# Altium integrated library WCAP-ATG5_rev15a.intlib: 201 symbols (part 2 of 3) (continued)
## WCAP-ATG5 10x12.5x5x0.6 860020775015
designator C?, comment 100 μF
WCAP-ATG5 Aluminum Electrolytic Capacitors , 100 μF; + / - 20%; 63 V , 10 x 12,5; Manufacturer: Wurth Elektronik; partNo: 860020775015; E-mail: libraries@we-online.com; Characteristics: Aluminum Electrolytic Capacitor; Recommended soldering: Wave; Operating temperature:–40 °C to +105 °C for UR < 400 V; –25 °C to +105 °C for UR ≥ 400 V; General purpose product series with max. temperature of +105 °C; Load life: 2000 h @ +105 °C; ComponentLink1Description: Manufacturer; ComponentLink1URL: http://www.we-online.com; ComponentLink2Description: Datasheet; ComponentLink2URL: http://katalog.we-online.de/pbs/datasheet/860020775015.pdf; Created by: Karrer Zheng; Created Date: 6/8/2015; Capacitance: 100 μF; Application: Medium and high voltage type range from 160V-450V used as primary side input filter in power supply; Low voltage type used as energy storage or low frequency filtering in circuit, applied to general switching power supply, AC-DC converter, adapter, charger, TV, VCR, DC motor circuit filter, digital audio, digital cameras, digital video cameras, satellite receiver etc.
footprint WCAP-ATG5 10x12.5x5x0.6
pins: 1, 2

## WCAP-ATG5 10x16x5x0.6 860020775016
designator C?, comment 120 μF
WCAP-ATG5 Aluminum Electrolytic Capacitors , 120 μF; + / - 20%; 63 V , 10 x 16; Manufacturer: Wurth Elektronik; partNo: 860020775016; E-mail: libraries@we-online.com; Characteristics: Aluminum Electrolytic Capacitor; Recommended soldering: Wave; Operating temperature:–40 °C to +105 °C for UR < 400 V; –25 °C to +105 °C for UR ≥ 400 V; General purpose product series with max. temperature of +105 °C; Load life: 2000 h @ +105 °C; ComponentLink1Description: Manufacturer; ComponentLink1URL: http://www.we-online.com; ComponentLink2Description: Datasheet; ComponentLink2URL: http://katalog.we-online.de/pbs/datasheet/860020775016.pdf; Created by: Karrer Zheng; Created Date: 6/8/2015; Capacitance: 120 μF; Application: Medium and high voltage type range from 160V-450V used as primary side input filter in power supply; Low voltage type used as energy storage or low frequency filtering in circuit, applied to general switching power supply, AC-DC converter, adapter, charger, TV, VCR, DC motor circuit filter, digital audio, digital cameras, digital video cameras, satellite receiver etc.
footprint WCAP-ATG5 10x16x5x0.6
pins: 1, 2

## WCAP-ATG5 10x16x5x0.6 860020775017
designator C?, comment 150 μF
WCAP-ATG5 Aluminum Electrolytic Capacitors , 150 μF; + / - 20%; 63 V , 10 x 16; Manufacturer: Wurth Elektronik; partNo: 860020775017; E-mail: libraries@we-online.com; Characteristics: Aluminum Electrolytic Capacitor; Recommended soldering: Wave; Operating temperature:–40 °C to +105 °C for UR < 400 V; –25 °C to +105 °C for UR ≥ 400 V; General purpose product series with max. temperature of +105 °C; Load life: 2000 h @ +105 °C; ComponentLink1Description: Manufacturer; ComponentLink1URL: http://www.we-online.com; ComponentLink2Description: Datasheet; ComponentLink2URL: http://katalog.we-online.de/pbs/datasheet/860020775017.pdf; Created by: Karrer Zheng; Created Date: 6/8/2015; Capacitance: 150 μF; Application: Medium and high voltage type range from 160V-450V used as primary side input filter in power supply; Low voltage type used as energy storage or low frequency filtering in circuit, applied to general switching power supply, AC-DC converter, adapter, charger, TV, VCR, DC motor circuit filter, digital audio, digital cameras, digital video cameras, satellite receiver etc.
footprint WCAP-ATG5 10x16x5x0.6
pins: 1, 2

## WCAP-ATG5 10x16x5x0.6 860020775018
designator C?, comment 180 μF
WCAP-ATG5 Aluminum Electrolytic Capacitors , 180 μF; + / - 20%; 63 V , 10 x 16; Manufacturer: Wurth Elektronik; partNo: 860020775018; E-mail: libraries@we-online.com; Characteristics: Aluminum Electrolytic Capacitor; Recommended soldering: Wave; Operating temperature:–40 °C to +105 °C for UR < 400 V; –25 °C to +105 °C for UR ≥ 400 V; General purpose product series with max. temperature of +105 °C; Load life: 2000 h @ +105 °C; ComponentLink1Description: Manufacturer; ComponentLink1URL: http://www.we-online.com; ComponentLink2Description: Datasheet; ComponentLink2URL: http://katalog.we-online.de/pbs/datasheet/860020775018.pdf; Created by: Karrer Zheng; Created Date: 6/8/2015; Capacitance: 180 μF; Application: Medium and high voltage type range from 160V-450V used as primary side input filter in power supply; Low voltage type used as energy storage or low frequency filtering in circuit, applied to general switching power supply, AC-DC converter, adapter, charger, TV, VCR, DC motor circuit filter, digital audio, digital cameras, digital video cameras, satellite receiver etc.
footprint WCAP-ATG5 10x16x5x0.6
pins: 1, 2

## WCAP-ATG5 10x16x5x0.6 860020775019
designator C?, comment 220 μF
WCAP-ATG5 Aluminum Electrolytic Capacitors , 220 μF; + / - 20%; 63 V , 10 x 16; Manufacturer: Wurth Elektronik; partNo: 860020775019; E-mail: libraries@we-online.com; Characteristics: Aluminum Electrolytic Capacitor; Recommended soldering: Wave; Operating temperature:–40 °C to +105 °C for UR < 400 V; –25 °C to +105 °C for UR ≥ 400 V; General purpose product series with max. temperature of +105 °C; Load life: 2000 h @ +105 °C; ComponentLink1Description: Manufacturer; ComponentLink1URL: http://www.we-online.com; ComponentLink2Description: Datasheet; ComponentLink2URL: http://katalog.we-online.de/pbs/datasheet/860020775019.pdf; Created by: Karrer Zheng; Created Date: 6/8/2015; Capacitance: 220 μF; Application: Medium and high voltage type range from 160V-450V used as primary side input filter in power supply; Low voltage type used as energy storage or low frequency filtering in circuit, applied to general switching power supply, AC-DC converter, adapter, charger, TV, VCR, DC motor circuit filter, digital audio, digital cameras, digital video cameras, satellite receiver etc.
footprint WCAP-ATG5 10x16x5x0.6
pins: 1, 2

## WCAP-ATG5 13x20x5x0.6 860020778020
designator C?, comment 330 μF
WCAP-ATG5 Aluminum Electrolytic Capacitors , 330 μF; + / - 20%; 63 V , 13 x 20; Manufacturer: Wurth Elektronik; partNo: 860020778020; E-mail: libraries@we-online.com; Characteristics: Aluminum Electrolytic Capacitor; Recommended soldering: Wave; Operating temperature:–40 °C to +105 °C for UR < 400 V; –25 °C to +105 °C for UR ≥ 400 V; General purpose product series with max. temperature of +105 °C; Load life: 2000 h @ +105 °C; ComponentLink1Description: Manufacturer; ComponentLink1URL: http://www.we-online.com; ComponentLink2Description: Datasheet; ComponentLink2URL: http://katalog.we-online.de/pbs/datasheet/860020778020.pdf; Created by: Karrer Zheng; Created Date: 6/8/2015; Capacitance: 330 μF; Application: Medium and high voltage type range from 160V-450V used as primary side input filter in power supply; Low voltage type used as energy storage or low frequency filtering in circuit, applied to general switching power supply, AC-DC converter, adapter, charger, TV, VCR, DC motor circuit filter, digital audio, digital cameras, digital video cameras, satellite receiver etc.
footprint WCAP-ATG5 13x20x5x0.6
pins: 1, 2

## WCAP-ATG5 13x20x5x0.6 860020778021
designator C?, comment 470 μF
WCAP-ATG5 Aluminum Electrolytic Capacitors , 470 μF; + / - 20%; 63 V , 13 x 20; Manufacturer: Wurth Elektronik; partNo: 860020778021; E-mail: libraries@we-online.com; Characteristics: Aluminum Electrolytic Capacitor; Recommended soldering: Wave; Operating temperature:–40 °C to +105 °C for UR < 400 V; –25 °C to +105 °C for UR ≥ 400 V; General purpose product series with max. temperature of +105 °C; Load life: 2000 h @ +105 °C; ComponentLink1Description: Manufacturer; ComponentLink1URL: http://www.we-online.com; ComponentLink2Description: Datasheet; ComponentLink2URL: http://katalog.we-online.de/pbs/datasheet/860020778021.pdf; Created by: Karrer Zheng; Created Date: 6/8/2015; Capacitance: 470 μF; Application: Medium and high voltage type range from 160V-450V used as primary side input filter in power supply; Low voltage type used as energy storage or low frequency filtering in circuit, applied to general switching power supply, AC-DC converter, adapter, charger, TV, VCR, DC motor circuit filter, digital audio, digital cameras, digital video cameras, satellite receiver etc.
footprint WCAP-ATG5 13x20x5x0.6
pins: 1, 2

## WCAP-ATG5 13x25x5x0.6 860020778022
designator C?, comment 560 μF
WCAP-ATG5 Aluminum Electrolytic Capacitors , 560 μF; + / - 20%; 63 V , 13 x 25; Manufacturer: Wurth Elektronik; partNo: 860020778022; E-mail: libraries@we-online.com; Characteristics: Aluminum Electrolytic Capacitor; Recommended soldering: Wave; Operating temperature:–40 °C to +105 °C for UR < 400 V; –25 °C to +105 °C for UR ≥ 400 V; General purpose product series with max. temperature of +105 °C; Load life: 2000 h @ +105 °C; ComponentLink1Description: Manufacturer; ComponentLink1URL: http://www.we-online.com; ComponentLink2Description: Datasheet; ComponentLink2URL: http://katalog.we-online.de/pbs/datasheet/860020778022.pdf; Created by: Karrer Zheng; Created Date: 6/8/2015; Capacitance: 560 μF; Application: Medium and high voltage type range from 160V-450V used as primary side input filter in power supply; Low voltage type used as energy storage or low frequency filtering in circuit, applied to general switching power supply, AC-DC converter, adapter, charger, TV, VCR, DC motor circuit filter, digital audio, digital cameras, digital video cameras, satellite receiver etc.
footprint WCAP-ATG5 13x25x5x0.6
pins: 1, 2

## WCAP-ATG5 16x25x7.5x0.8 860020780023
designator C?, comment 680 μF
WCAP-ATG5 Aluminum Electrolytic Capacitors , 680 μF; + / - 20%; 63 V , 16 x 25; Manufacturer: Wurth Elektronik; partNo: 860020780023; E-mail: libraries@we-online.com; Characteristics: Aluminum Electrolytic Capacitor; Recommended soldering: Wave; Operating temperature:–40 °C to +105 °C for UR < 400 V; –25 °C to +105 °C for UR ≥ 400 V; General purpose product series with max. temperature of +105 °C; Load life: 2000 h @ +105 °C; ComponentLink1Description: Manufacturer; ComponentLink1URL: http://www.we-online.com; ComponentLink2Description: Datasheet; ComponentLink2URL: http://katalog.we-online.de/pbs/datasheet/860020780023.pdf; Created by: Karrer Zheng; Created Date: 6/8/2015; Capacitance: 680 μF; Application: Medium and high voltage type range from 160V-450V used as primary side input filter in power supply; Low voltage type used as energy storage or low frequency filtering in circuit, applied to general switching power supply, AC-DC converter, adapter, charger, TV, VCR, DC motor circuit filter, digital audio, digital cameras, digital video cameras, satellite receiver etc.
footprint WCAP-ATG5 16x25x7.5x0.8
pins: 1, 2

## WCAP-ATG5 16x25x7.5x0.8 860020780024
designator C?, comment 820 μF
WCAP-ATG5 Aluminum Electrolytic Capacitors , 820 μF; + / - 20%; 63 V , 16 x 25; Manufacturer: Wurth Elektronik; partNo: 860020780024; E-mail: libraries@we-online.com; Characteristics: Aluminum Electrolytic Capacitor; Recommended soldering: Wave; Operating temperature:–40 °C to +105 °C for UR < 400 V; –25 °C to +105 °C for UR ≥ 400 V; General purpose product series with max. temperature of +105 °C; Load life: 2000 h @ +105 °C; ComponentLink1Description: Manufacturer; ComponentLink1URL: http://www.we-online.com; ComponentLink2Description: Datasheet; ComponentLink2URL: http://katalog.we-online.de/pbs/datasheet/860020780024.pdf; Created by: Karrer Zheng; Created Date: 6/8/2015; Capacitance: 820 μF; Application: Medium and high voltage type range from 160V-450V used as primary side input filter in power supply; Low voltage type used as energy storage or low frequency filtering in circuit, applied to general switching power supply, AC-DC converter, adapter, charger, TV, VCR, DC motor circuit filter, digital audio, digital cameras, digital video cameras, satellite receiver etc.
footprint WCAP-ATG5 16x25x7.5x0.8
pins: 1, 2

## WCAP-ATG5 16x31.5x7.5x0.8 860020780025
designator C?, comment 1000 μF
WCAP-ATG5 Aluminum Electrolytic Capacitors , 1000 μF; + / - 20%; 63 V , 16 x 31,5; Manufacturer: Wurth Elektronik; partNo: 860020780025; E-mail: libraries@we-online.com; Characteristics: Aluminum Electrolytic Capacitor; Recommended soldering: Wave; Operating temperature:–40 °C to +105 °C for UR < 400 V; –25 °C to +105 °C for UR ≥ 400 V; General purpose product series with max. temperature of +105 °C; Load life: 2000 h @ +105 °C; ComponentLink1Description: Manufacturer; ComponentLink1URL: http://www.we-online.com; ComponentLink2Description: Datasheet; ComponentLink2URL: http://katalog.we-online.de/pbs/datasheet/860020780025.pdf; Created by: Karrer Zheng; Created Date: 6/8/2015; Capacitance: 1000 μF; Application: Medium and high voltage type range from 160V-450V used as primary side input filter in power supply; Low voltage type used as energy storage or low frequency filtering in circuit, applied to general switching power supply, AC-DC converter, adapter, charger, TV, VCR, DC motor circuit filter, digital audio, digital cameras, digital video cameras, satellite receiver etc.
footprint WCAP-ATG5 16x31.5x7.5x0.8
pins: 1, 2

## WCAP-ATG5 16x35.5x7.5x0.8 860020780026
designator C?, comment 1200 μF
WCAP-ATG5 Aluminum Electrolytic Capacitors , 1200 μF; + / - 20%; 63 V , 16 x 35,5; Manufacturer: Wurth Elektronik; partNo: 860020780026; E-mail: libraries@we-online.com; Characteristics: Aluminum Electrolytic Capacitor; Recommended soldering: Wave; Operating temperature:–40 °C to +105 °C for UR < 400 V; –25 °C to +105 °C for UR ≥ 400 V; General purpose product series with max. temperature of +105 °C; Load life: 2000 h @ +105 °C; ComponentLink1Description: Manufacturer; ComponentLink1URL: http://www.we-online.com; ComponentLink2Description: Datasheet; ComponentLink2URL: http://katalog.we-online.de/pbs/datasheet/860020780026.pdf; Created by: Karrer Zheng; Created Date: 6/8/2015; Capacitance: 1200 μF; Application: Medium and high voltage type range from 160V-450V used as primary side input filter in power supply; Low voltage type used as energy storage or low frequency filtering in circuit, applied to general switching power supply, AC-DC converter, adapter, charger, TV, VCR, DC motor circuit filter, digital audio, digital cameras, digital video cameras, satellite receiver etc.
footprint WCAP-ATG5 16x35.5x7.5x0.8
pins: 1, 2

## WCAP-ATG5 18x31.5x7.5x0.8 860020781027
designator C?, comment 1500 μF
WCAP-ATG5 Aluminum Electrolytic Capacitors , 1500 μF; + / - 20%; 63 V , 18 x 31,5; Manufacturer: Wurth Elektronik; partNo: 860020781027; E-mail: libraries@we-online.com; Characteristics: Aluminum Electrolytic Capacitor; Recommended soldering: Wave; Operating temperature:–40 °C to +105 °C for UR < 400 V; –25 °C to +105 °C for UR ≥ 400 V; General purpose product series with max. temperature of +105 °C; Load life: 2000 h @ +105 °C; ComponentLink1Description: Manufacturer; ComponentLink1URL: http://www.we-online.com; ComponentLink2Description: Datasheet; ComponentLink2URL: http://katalog.we-online.de/pbs/datasheet/860020781027.pdf; Created by: Karrer Zheng; Created Date: 6/8/2015; Capacitance: 1500 μF; Application: Medium and high voltage type range from 160V-450V used as primary side input filter in power supply; Low voltage type used as energy storage or low frequency filtering in circuit, applied to general switching power supply, AC-DC converter, adapter, charger, TV, VCR, DC motor circuit filter, digital audio, digital cameras, digital video cameras, satellite receiver etc.
footprint WCAP-ATG5 18x31.5x7.5x0.8
pins: 1, 2


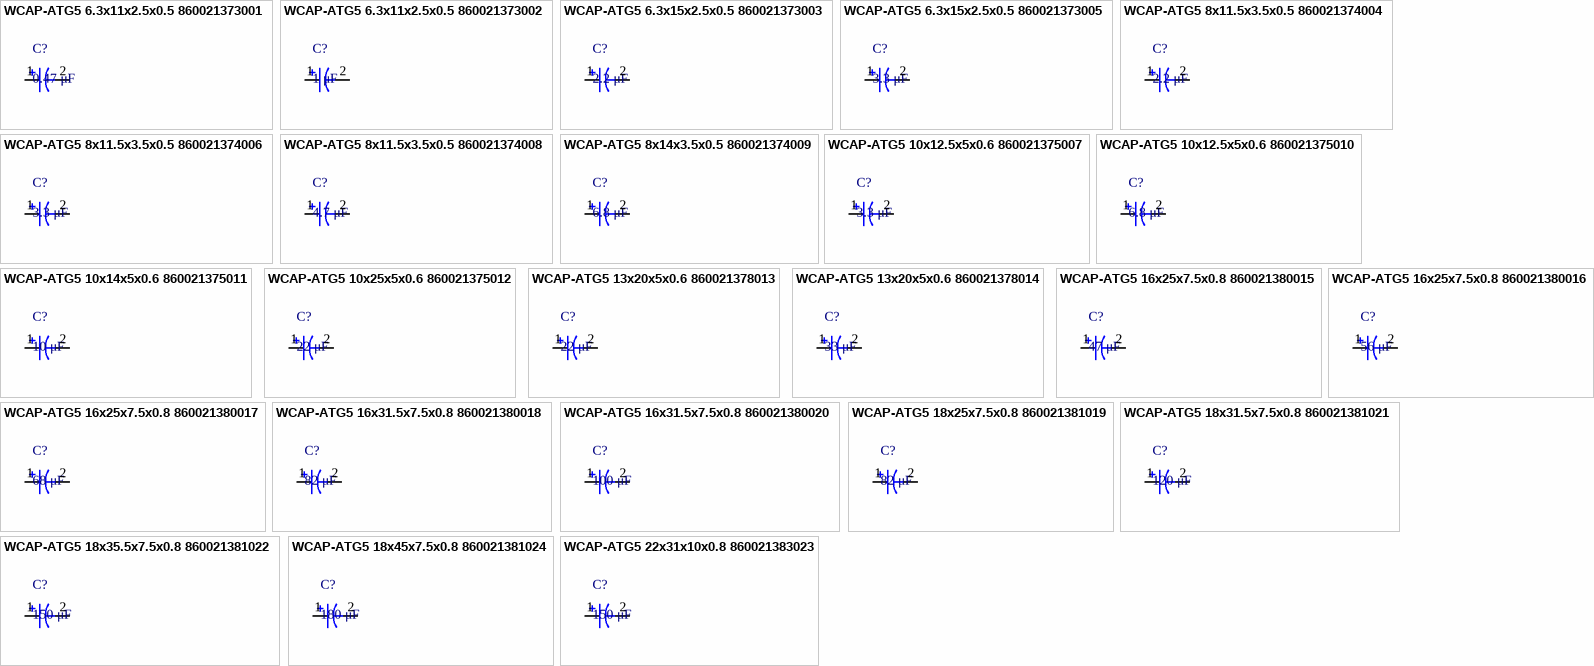
[diagram p5: symbols WCAP-ATG5 6.3x11x2.5x0.5 860021373001 to WCAP-ATG5 22x31x10x0.8 860021383023]

## WCAP-ATG5 6.3x11x2.5x0.5 860021373001
designator C?, comment 0.47 μF
WCAP-ATG5 Aluminum Electrolytic Capacitors , 0,47 μF; + / - 20%; 400 V , 6,3 x 11; Manufacturer: Wurth Elektronik; partNo: 860021373001; E-mail: libraries@we-online.com; Characteristics: Aluminum Electrolytic Capacitor; Recommended soldering: Wave; Operating temperature:–40 °C to +105 °C for UR < 400 V; –25 °C to +105 °C for UR ≥ 400 V; General purpose product series with max. temperature of +105 °C; Load life: 2000 h @ +105 °C; ComponentLink1Description: Manufacturer; ComponentLink1URL: http://www.we-online.com; ComponentLink2Description: Datasheet; ComponentLink2URL: http://katalog.we-online.de/pbs/datasheet/860021373001.pdf; Created by: Karrer Zheng; Created Date: 6/8/2015; Capacitance: 0.47 μF; Application: Medium and high voltage type range from 160V-450V used as primary side input filter in power supply; Low voltage type used as energy storage or low frequency filtering in circuit, applied to general switching power supply, AC-DC converter, adapter, charger, TV, VCR, DC motor circuit filter, digital audio, digital cameras, digital video cameras, satellite receiver etc.
footprint WCAP-ATG5 6.3x11x2.5x0.5
pins: 1, 2

## WCAP-ATG5 6.3x11x2.5x0.5 860021373002
designator C?, comment 1 μF
WCAP-ATG5 Aluminum Electrolytic Capacitors , 1 μF; + / - 20%; 400 V , 6,3 x 11; Manufacturer: Wurth Elektronik; partNo: 860021373002; E-mail: libraries@we-online.com; Characteristics: Aluminum Electrolytic Capacitor; Recommended soldering: Wave; Operating temperature:–40 °C to +105 °C for UR < 400 V; –25 °C to +105 °C for UR ≥ 400 V; General purpose product series with max. temperature of +105 °C; Load life: 2000 h @ +105 °C; ComponentLink1Description: Manufacturer; ComponentLink1URL: http://www.we-online.com; ComponentLink2Description: Datasheet; ComponentLink2URL: http://katalog.we-online.de/pbs/datasheet/860021373002.pdf; Created by: Karrer Zheng; Created Date: 6/8/2015; Capacitance: 1 μF; Application: Medium and high voltage type range from 160V-450V used as primary side input filter in power supply; Low voltage type used as energy storage or low frequency filtering in circuit, applied to general switching power supply, AC-DC converter, adapter, charger, TV, VCR, DC motor circuit filter, digital audio, digital cameras, digital video cameras, satellite receiver etc.
footprint WCAP-ATG5 6.3x11x2.5x0.5
pins: 1, 2

## WCAP-ATG5 6.3x15x2.5x0.5 860021373003
designator C?, comment 2.2 μF
WCAP-ATG5 Aluminum Electrolytic Capacitors , 2,2 μF; + / - 20%; 400 V , 6,3 x 15; Manufacturer: Wurth Elektronik; partNo: 860021373003; E-mail: libraries@we-online.com; Characteristics: Aluminum Electrolytic Capacitor; Recommended soldering: Wave; Operating temperature:–40 °C to +105 °C for UR < 400 V; –25 °C to +105 °C for UR ≥ 400 V; General purpose product series with max. temperature of +105 °C; Load life: 2000 h @ +105 °C; ComponentLink1Description: Manufacturer; ComponentLink1URL: http://www.we-online.com; ComponentLink2Description: Datasheet; ComponentLink2URL: http://katalog.we-online.de/pbs/datasheet/860021373003.pdf; Created by: Karrer Zheng; Created Date: 6/8/2015; Capacitance: 2.2 μF; Application: Medium and high voltage type range from 160V-450V used as primary side input filter in power supply; Low voltage type used as energy storage or low frequency filtering in circuit, applied to general switching power supply, AC-DC converter, adapter, charger, TV, VCR, DC motor circuit filter, digital audio, digital cameras, digital video cameras, satellite receiver etc.
footprint WCAP-ATG5 6.3x15x2.5x0.5
pins: 1, 2

## WCAP-ATG5 6.3x15x2.5x0.5 860021373005
designator C?, comment 3.3 μF
WCAP-ATG5 Aluminum Electrolytic Capacitors , 3,3 μF; + / - 20%; 400 V , 6,3 x 15; Manufacturer: Wurth Elektronik; partNo: 860021373005; E-mail: libraries@we-online.com; Characteristics: Aluminum Electrolytic Capacitor; Recommended soldering: Wave; Operating temperature:–40 °C to +105 °C for UR < 400 V; –25 °C to +105 °C for UR ≥ 400 V; General purpose product series with max. temperature of +105 °C; Load life: 2000 h @ +105 °C; ComponentLink1Description: Manufacturer; ComponentLink1URL: http://www.we-online.com; ComponentLink2Description: Datasheet; ComponentLink2URL: http://katalog.we-online.de/pbs/datasheet/860021373005.pdf; Created by: Karrer Zheng; Created Date: 6/8/2015; Capacitance: 3.3 μF; Application: Medium and high voltage type range from 160V-450V used as primary side input filter in power supply; Low voltage type used as energy storage or low frequency filtering in circuit, applied to general switching power supply, AC-DC converter, adapter, charger, TV, VCR, DC motor circuit filter, digital audio, digital cameras, digital video cameras, satellite receiver etc.
footprint WCAP-ATG5 6.3x15x2.5x0.5
pins: 1, 2

## WCAP-ATG5 8x11.5x3.5x0.5 860021374004
designator C?, comment 2.2 μF
WCAP-ATG5 Aluminum Electrolytic Capacitors , 2,2 μF; + / - 20%; 400 V , 8 x 11,5; Manufacturer: Wurth Elektronik; partNo: 860021374004; E-mail: libraries@we-online.com; Characteristics: Aluminum Electrolytic Capacitor; Recommended soldering: Wave; Operating temperature:–40 °C to +105 °C for UR < 400 V; –25 °C to +105 °C for UR ≥ 400 V; General purpose product series with max. temperature of +105 °C; Load life: 2000 h @ +105 °C; ComponentLink1Description: Manufacturer; ComponentLink1URL: http://www.we-online.com; ComponentLink2Description: Datasheet; ComponentLink2URL: http://katalog.we-online.de/pbs/datasheet/860021374004.pdf; Created by: Karrer Zheng; Created Date: 6/8/2015; Capacitance: 2.2 μF; Application: Medium and high voltage type range from 160V-450V used as primary side input filter in power supply; Low voltage type used as energy storage or low frequency filtering in circuit, applied to general switching power supply, AC-DC converter, adapter, charger, TV, VCR, DC motor circuit filter, digital audio, digital cameras, digital video cameras, satellite receiver etc.
footprint WCAP-ATG5 8x11.5x3.5x0.5
pins: 1, 2

## WCAP-ATG5 8x11.5x3.5x0.5 860021374006
designator C?, comment 3.3 μF
WCAP-ATG5 Aluminum Electrolytic Capacitors , 3,3 μF; + / - 20%; 400 V , 8 x 11,5; Manufacturer: Wurth Elektronik; partNo: 860021374006; E-mail: libraries@we-online.com; Characteristics: Aluminum Electrolytic Capacitor; Recommended soldering: Wave; Operating temperature:–40 °C to +105 °C for UR < 400 V; –25 °C to +105 °C for UR ≥ 400 V; General purpose product series with max. temperature of +105 °C; Load life: 2000 h @ +105 °C; ComponentLink1Description: Manufacturer; ComponentLink1URL: http://www.we-online.com; ComponentLink2Description: Datasheet; ComponentLink2URL: http://katalog.we-online.de/pbs/datasheet/860021374006.pdf; Created by: Karrer Zheng; Created Date: 6/8/2015; Capacitance: 3.3 μF; Application: Medium and high voltage type range from 160V-450V used as primary side input filter in power supply; Low voltage type used as energy storage or low frequency filtering in circuit, applied to general switching power supply, AC-DC converter, adapter, charger, TV, VCR, DC motor circuit filter, digital audio, digital cameras, digital video cameras, satellite receiver etc.
footprint WCAP-ATG5 8x11.5x3.5x0.5
pins: 1, 2

## WCAP-ATG5 8x11.5x3.5x0.5 860021374008
designator C?, comment 4.7 μF
WCAP-ATG5 Aluminum Electrolytic Capacitors , 4,7 μF; + / - 20%; 400 V , 8 x 11,5; Manufacturer: Wurth Elektronik; partNo: 860021374008; E-mail: libraries@we-online.com; Characteristics: Aluminum Electrolytic Capacitor; Recommended soldering: Wave; Operating temperature:–40 °C to +105 °C for UR < 400 V; –25 °C to +105 °C for UR ≥ 400 V; General purpose product series with max. temperature of +105 °C; Load life: 2000 h @ +105 °C; ComponentLink1Description: Manufacturer; ComponentLink1URL: http://www.we-online.com; ComponentLink2Description: Datasheet; ComponentLink2URL: http://katalog.we-online.de/pbs/datasheet/860021374008.pdf; Created by: Karrer Zheng; Created Date: 6/8/2015; Capacitance: 4.7 μF; Application: Medium and high voltage type range from 160V-450V used as primary side input filter in power supply; Low voltage type used as energy storage or low frequency filtering in circuit, applied to general switching power supply, AC-DC converter, adapter, charger, TV, VCR, DC motor circuit filter, digital audio, digital cameras, digital video cameras, satellite receiver etc.
footprint WCAP-ATG5 8x11.5x3.5x0.5
pins: 1, 2

## WCAP-ATG5 8x14x3.5x0.5 860021374009
designator C?, comment 6.8 μF
WCAP-ATG5 Aluminum Electrolytic Capacitors , 6,8 μF; + / - 20%; 400 V , 8 x 14; Manufacturer: Wurth Elektronik; partNo: 860021374009; E-mail: libraries@we-online.com; Characteristics: Aluminum Electrolytic Capacitor; Recommended soldering: Wave; Operating temperature:–40 °C to +105 °C for UR < 400 V; –25 °C to +105 °C for UR ≥ 400 V; General purpose product series with max. temperature of +105 °C; Load life: 2000 h @ +105 °C; ComponentLink1Description: Manufacturer; ComponentLink1URL: http://www.we-online.com; ComponentLink2Description: Datasheet; ComponentLink2URL: http://katalog.we-online.de/pbs/datasheet/860021374009.pdf; Created by: Karrer Zheng; Created Date: 6/8/2015; Capacitance: 6.8 μF; Application: Medium and high voltage type range from 160V-450V used as primary side input filter in power supply; Low voltage type used as energy storage or low frequency filtering in circuit, applied to general switching power supply, AC-DC converter, adapter, charger, TV, VCR, DC motor circuit filter, digital audio, digital cameras, digital video cameras, satellite receiver etc.
footprint WCAP-ATG5 8x14x3.5x0.5
pins: 1, 2

## WCAP-ATG5 10x12.5x5x0.6 860021375007
designator C?, comment 3.3 μF
WCAP-ATG5 Aluminum Electrolytic Capacitors , 3,3 μF; + / - 20%; 400 V , 10 x 12,5; Manufacturer: Wurth Elektronik; partNo: 860021375007; E-mail: libraries@we-online.com; Characteristics: Aluminum Electrolytic Capacitor; Recommended soldering: Wave; Operating temperature:–40 °C to +105 °C for UR < 400 V; –25 °C to +105 °C for UR ≥ 400 V; General purpose product series with max. temperature of +105 °C; Load life: 2000 h @ +105 °C; ComponentLink1Description: Manufacturer; ComponentLink1URL: http://www.we-online.com; ComponentLink2Description: Datasheet; ComponentLink2URL: http://katalog.we-online.de/pbs/datasheet/860021375007.pdf; Created by: Karrer Zheng; Created Date: 6/8/2015; Capacitance: 3.3 μF; Application: Medium and high voltage type range from 160V-450V used as primary side input filter in power supply; Low voltage type used as energy storage or low frequency filtering in circuit, applied to general switching power supply, AC-DC converter, adapter, charger, TV, VCR, DC motor circuit filter, digital audio, digital cameras, digital video cameras, satellite receiver etc.
footprint WCAP-ATG5 10x12.5x5x0.6
pins: 1, 2

## WCAP-ATG5 10x12.5x5x0.6 860021375010
designator C?, comment 6.8 μF
WCAP-ATG5 Aluminum Electrolytic Capacitors , 6,8 μF; + / - 20%; 400 V , 10 x 12,5; Manufacturer: Wurth Elektronik; partNo: 860021375010; E-mail: libraries@we-online.com; Characteristics: Aluminum Electrolytic Capacitor; Recommended soldering: Wave; Operating temperature:–40 °C to +105 °C for UR < 400 V; –25 °C to +105 °C for UR ≥ 400 V; General purpose product series with max. temperature of +105 °C; Load life: 2000 h @ +105 °C; ComponentLink1Description: Manufacturer; ComponentLink1URL: http://www.we-online.com; ComponentLink2Description: Datasheet; ComponentLink2URL: http://katalog.we-online.de/pbs/datasheet/860021375010.pdf; Created by: Karrer Zheng; Created Date: 6/8/2015; Capacitance: 6.8 μF; Application: Medium and high voltage type range from 160V-450V used as primary side input filter in power supply; Low voltage type used as energy storage or low frequency filtering in circuit, applied to general switching power supply, AC-DC converter, adapter, charger, TV, VCR, DC motor circuit filter, digital audio, digital cameras, digital video cameras, satellite receiver etc.
footprint WCAP-ATG5 10x12.5x5x0.6
pins: 1, 2

## WCAP-ATG5 10x14x5x0.6 860021375011
designator C?, comment 10 μF
WCAP-ATG5 Aluminum Electrolytic Capacitors , 10 μF; + / - 20%; 400 V , 10 x 14; Manufacturer: Wurth Elektronik; partNo: 860021375011; E-mail: libraries@we-online.com; Characteristics: Aluminum Electrolytic Capacitor; Recommended soldering: Wave; Operating temperature:–40 °C to +105 °C for UR < 400 V; –25 °C to +105 °C for UR ≥ 400 V; General purpose product series with max. temperature of +105 °C; Load life: 2000 h @ +105 °C; ComponentLink1Description: Manufacturer; ComponentLink1URL: http://www.we-online.com; ComponentLink2Description: Datasheet; ComponentLink2URL: http://katalog.we-online.de/pbs/datasheet/860021375011.pdf; Created by: Karrer Zheng; Created Date: 6/8/2015; Capacitance: 10 μF; Application: Medium and high voltage type range from 160V-450V used as primary side input filter in power supply; Low voltage type used as energy storage or low frequency filtering in circuit, applied to general switching power supply, AC-DC converter, adapter, charger, TV, VCR, DC motor circuit filter, digital audio, digital cameras, digital video cameras, satellite receiver etc.
footprint WCAP-ATG5 10x14x5x0.6
pins: 1, 2

## WCAP-ATG5 10x25x5x0.6 860021375012
designator C?, comment 22 μF
WCAP-ATG5 Aluminum Electrolytic Capacitors , 22 μF; + / - 20%; 400 V , 10 x 25; Manufacturer: Wurth Elektronik; partNo: 860021375012; E-mail: libraries@we-online.com; Characteristics: Aluminum Electrolytic Capacitor; Recommended soldering: Wave; Operating temperature:–40 °C to +105 °C for UR < 400 V; –25 °C to +105 °C for UR ≥ 400 V; General purpose product series with max. temperature of +105 °C; Load life: 2000 h @ +105 °C; ComponentLink1Description: Manufacturer; ComponentLink1URL: http://www.we-online.com; ComponentLink2Description: Datasheet; ComponentLink2URL: http://katalog.we-online.de/pbs/datasheet/860021375012.pdf; Created by: Karrer Zheng; Created Date: 6/8/2015; Capacitance: 22 μF; Application: Medium and high voltage type range from 160V-450V used as primary side input filter in power supply; Low voltage type used as energy storage or low frequency filtering in circuit, applied to general switching power supply, AC-DC converter, adapter, charger, TV, VCR, DC motor circuit filter, digital audio, digital cameras, digital video cameras, satellite receiver etc.
footprint WCAP-ATG5 10x25x5x0.6
pins: 1, 2

## WCAP-ATG5 13x20x5x0.6 860021378013
designator C?, comment 22 μF
WCAP-ATG5 Aluminum Electrolytic Capacitors , 22 μF; + / - 20%; 400 V , 13 x 20; Manufacturer: Wurth Elektronik; partNo: 860021378013; E-mail: libraries@we-online.com; Characteristics: Aluminum Electrolytic Capacitor; Recommended soldering: Wave; Operating temperature:–40 °C to +105 °C for UR < 400 V; –25 °C to +105 °C for UR ≥ 400 V; General purpose product series with max. temperature of +105 °C; Load life: 2000 h @ +105 °C; ComponentLink1Description: Manufacturer; ComponentLink1URL: http://www.we-online.com; ComponentLink2Description: Datasheet; ComponentLink2URL: http://katalog.we-online.de/pbs/datasheet/860021378013.pdf; Created by: Karrer Zheng; Created Date: 6/8/2015; Capacitance: 22 μF; Application: Medium and high voltage type range from 160V-450V used as primary side input filter in power supply; Low voltage type used as energy storage or low frequency filtering in circuit, applied to general switching power supply, AC-DC converter, adapter, charger, TV, VCR, DC motor circuit filter, digital audio, digital cameras, digital video cameras, satellite receiver etc.
footprint WCAP-ATG5 13x20x5x0.6
pins: 1, 2

## WCAP-ATG5 13x20x5x0.6 860021378014
designator C?, comment 33 μF
WCAP-ATG5 Aluminum Electrolytic Capacitors , 33 μF; + / - 20%; 400 V , 13 x 20; Manufacturer: Wurth Elektronik; partNo: 860021378014; E-mail: libraries@we-online.com; Characteristics: Aluminum Electrolytic Capacitor; Recommended soldering: Wave; Operating temperature:–40 °C to +105 °C for UR < 400 V; –25 °C to +105 °C for UR ≥ 400 V; General purpose product series with max. temperature of +105 °C; Load life: 2000 h @ +105 °C; ComponentLink1Description: Manufacturer; ComponentLink1URL: http://www.we-online.com; ComponentLink2Description: Datasheet; ComponentLink2URL: http://katalog.we-online.de/pbs/datasheet/860021378014.pdf; Created by: Karrer Zheng; Created Date: 6/8/2015; Capacitance: 33 μF; Application: Medium and high voltage type range from 160V-450V used as primary side input filter in power supply; Low voltage type used as energy storage or low frequency filtering in circuit, applied to general switching power supply, AC-DC converter, adapter, charger, TV, VCR, DC motor circuit filter, digital audio, digital cameras, digital video cameras, satellite receiver etc.
footprint WCAP-ATG5 13x20x5x0.6
pins: 1, 2

## WCAP-ATG5 16x25x7.5x0.8 860021380015
designator C?, comment 47 μF
WCAP-ATG5 Aluminum Electrolytic Capacitors , 47 μF; + / - 20%; 400 V , 16 x 25; Manufacturer: Wurth Elektronik; partNo: 860021380015; E-mail: libraries@we-online.com; Characteristics: Aluminum Electrolytic Capacitor; Recommended soldering: Wave; Operating temperature:–40 °C to +105 °C for UR < 400 V; –25 °C to +105 °C for UR ≥ 400 V; General purpose product series with max. temperature of +105 °C; Load life: 2000 h @ +105 °C; ComponentLink1Description: Manufacturer; ComponentLink1URL: http://www.we-online.com; ComponentLink2Description: Datasheet; ComponentLink2URL: http://katalog.we-online.de/pbs/datasheet/860021380015.pdf; Created by: Karrer Zheng; Created Date: 6/8/2015; Capacitance: 47 μF; Application: Medium and high voltage type range from 160V-450V used as primary side input filter in power supply; Low voltage type used as energy storage or low frequency filtering in circuit, applied to general switching power supply, AC-DC converter, adapter, charger, TV, VCR, DC motor circuit filter, digital audio, digital cameras, digital video cameras, satellite receiver etc.
footprint WCAP-ATG5 16x25x7.5x0.8
pins: 1, 2

## WCAP-ATG5 16x25x7.5x0.8 860021380016
designator C?, comment 56 μF
WCAP-ATG5 Aluminum Electrolytic Capacitors , 56 μF; + / - 20%; 400 V , 16 x 25; Manufacturer: Wurth Elektronik; partNo: 860021380016; E-mail: libraries@we-online.com; Characteristics: Aluminum Electrolytic Capacitor; Recommended soldering: Wave; Operating temperature:–40 °C to +105 °C for UR < 400 V; –25 °C to +105 °C for UR ≥ 400 V; General purpose product series with max. temperature of +105 °C; Load life: 2000 h @ +105 °C; ComponentLink1Description: Manufacturer; ComponentLink1URL: http://www.we-online.com; ComponentLink2Description: Datasheet; ComponentLink2URL: http://katalog.we-online.de/pbs/datasheet/860021380016.pdf; Created by: Karrer Zheng; Created Date: 6/8/2015; Capacitance: 56 μF; Application: Medium and high voltage type range from 160V-450V used as primary side input filter in power supply; Low voltage type used as energy storage or low frequency filtering in circuit, applied to general switching power supply, AC-DC converter, adapter, charger, TV, VCR, DC motor circuit filter, digital audio, digital cameras, digital video cameras, satellite receiver etc.
footprint WCAP-ATG5 16x25x7.5x0.8
pins: 1, 2

## WCAP-ATG5 16x25x7.5x0.8 860021380017
designator C?, comment 68 μF
WCAP-ATG5 Aluminum Electrolytic Capacitors , 68 μF; + / - 20%; 400 V , 16 x 25; Manufacturer: Wurth Elektronik; partNo: 860021380017; E-mail: libraries@we-online.com; Characteristics: Aluminum Electrolytic Capacitor; Recommended soldering: Wave; Operating temperature:–40 °C to +105 °C for UR < 400 V; –25 °C to +105 °C for UR ≥ 400 V; General purpose product series with max. temperature of +105 °C; Load life: 2000 h @ +105 °C; ComponentLink1Description: Manufacturer; ComponentLink1URL: http://www.we-online.com; ComponentLink2Description: Datasheet; ComponentLink2URL: http://katalog.we-online.de/pbs/datasheet/860021380017.pdf; Created by: Karrer Zheng; Created Date: 6/8/2015; Capacitance: 68 μF; Application: Medium and high voltage type range from 160V-450V used as primary side input filter in power supply; Low voltage type used as energy storage or low frequency filtering in circuit, applied to general switching power supply, AC-DC converter, adapter, charger, TV, VCR, DC motor circuit filter, digital audio, digital cameras, digital video cameras, satellite receiver etc.
footprint WCAP-ATG5 16x25x7.5x0.8
pins: 1, 2

## WCAP-ATG5 16x31.5x7.5x0.8 860021380018
designator C?, comment 82 μF
WCAP-ATG5 Aluminum Electrolytic Capacitors , 82 μF; + / - 20%; 400 V , 16 x 31,5; Manufacturer: Wurth Elektronik; partNo: 860021380018; E-mail: libraries@we-online.com; Characteristics: Aluminum Electrolytic Capacitor; Recommended soldering: Wave; Operating temperature:–40 °C to +105 °C for UR < 400 V; –25 °C to +105 °C for UR ≥ 400 V; General purpose product series with max. temperature of +105 °C; Load life: 2000 h @ +105 °C; ComponentLink1Description: Manufacturer; ComponentLink1URL: http://www.we-online.com; ComponentLink2Description: Datasheet; ComponentLink2URL: http://katalog.we-online.de/pbs/datasheet/860021380018.pdf; Created by: Karrer Zheng; Created Date: 6/8/2015; Capacitance: 82 μF; Application: Medium and high voltage type range from 160V-450V used as primary side input filter in power supply; Low voltage type used as energy storage or low frequency filtering in circuit, applied to general switching power supply, AC-DC converter, adapter, charger, TV, VCR, DC motor circuit filter, digital audio, digital cameras, digital video cameras, satellite receiver etc.
footprint WCAP-ATG5 16x31.5x7.5x0.8
pins: 1, 2

## WCAP-ATG5 16x31.5x7.5x0.8 860021380020
designator C?, comment 100 μF
WCAP-ATG5 Aluminum Electrolytic Capacitors , 100 μF; + / - 20%; 400 V , 16 x 31,5; Manufacturer: Wurth Elektronik; partNo: 860021380020; E-mail: libraries@we-online.com; Characteristics: Aluminum Electrolytic Capacitor; Recommended soldering: Wave; Operating temperature:–40 °C to +105 °C for UR < 400 V; –25 °C to +105 °C for UR ≥ 400 V; General purpose product series with max. temperature of +105 °C; Load life: 2000 h @ +105 °C; ComponentLink1Description: Manufacturer; ComponentLink1URL: http://www.we-online.com; ComponentLink2Description: Datasheet; ComponentLink2URL: http://katalog.we-online.de/pbs/datasheet/860021380020.pdf; Created by: Karrer Zheng; Created Date: 6/8/2015; Capacitance: 100 μF; Application: Medium and high voltage type range from 160V-450V used as primary side input filter in power supply; Low voltage type used as energy storage or low frequency filtering in circuit, applied to general switching power supply, AC-DC converter, adapter, charger, TV, VCR, DC motor circuit filter, digital audio, digital cameras, digital video cameras, satellite receiver etc.
footprint WCAP-ATG5 16x31.5x7.5x0.8
pins: 1, 2

## WCAP-ATG5 18x25x7.5x0.8 860021381019
designator C?, comment 82 μF
WCAP-ATG5 Aluminum Electrolytic Capacitors , 82 μF; + / - 20%; 400 V , 18 x 25; Manufacturer: Wurth Elektronik; partNo: 860021381019; E-mail: libraries@we-online.com; Characteristics: Aluminum Electrolytic Capacitor; Recommended soldering: Wave; Operating temperature:–40 °C to +105 °C for UR < 400 V; –25 °C to +105 °C for UR ≥ 400 V; General purpose product series with max. temperature of +105 °C; Load life: 2000 h @ +105 °C; ComponentLink1Description: Manufacturer; ComponentLink1URL: http://www.we-online.com; ComponentLink2Description: Datasheet; ComponentLink2URL: http://katalog.we-online.de/pbs/datasheet/860021381019.pdf; Created by: Karrer Zheng; Created Date: 6/8/2015; Capacitance: 82 μF; Application: Medium and high voltage type range from 160V-450V used as primary side input filter in power supply; Low voltage type used as energy storage or low frequency filtering in circuit, applied to general switching power supply, AC-DC converter, adapter, charger, TV, VCR, DC motor circuit filter, digital audio, digital cameras, digital video cameras, satellite receiver etc.
footprint WCAP-ATG5 18x25x7.5x0.8
pins: 1, 2

## WCAP-ATG5 18x31.5x7.5x0.8 860021381021
designator C?, comment 120 μF
WCAP-ATG5 Aluminum Electrolytic Capacitors , 120 μF; + / - 20%; 400 V , 18 x 31,5; Manufacturer: Wurth Elektronik; partNo: 860021381021; E-mail: libraries@we-online.com; Characteristics: Aluminum Electrolytic Capacitor; Recommended soldering: Wave; Operating temperature:–40 °C to +105 °C for UR < 400 V; –25 °C to +105 °C for UR ≥ 400 V; General purpose product series with max. temperature of +105 °C; Load life: 2000 h @ +105 °C; ComponentLink1Description: Manufacturer; ComponentLink1URL: http://www.we-online.com; ComponentLink2Description: Datasheet; ComponentLink2URL: http://katalog.we-online.de/pbs/datasheet/860021381021.pdf; Created by: Karrer Zheng; Created Date: 6/8/2015; Capacitance: 120 μF; Application: Medium and high voltage type range from 160V-450V used as primary side input filter in power supply; Low voltage type used as energy storage or low frequency filtering in circuit, applied to general switching power supply, AC-DC converter, adapter, charger, TV, VCR, DC motor circuit filter, digital audio, digital cameras, digital video cameras, satellite receiver etc.
footprint WCAP-ATG5 18x31.5x7.5x0.8
pins: 1, 2

## WCAP-ATG5 18x35.5x7.5x0.8 860021381022
designator C?, comment 150 μF
WCAP-ATG5 Aluminum Electrolytic Capacitors , 150 μF; + / - 20%; 400 V , 18 x 35,5; Manufacturer: Wurth Elektronik; partNo: 860021381022; E-mail: libraries@we-online.com; Characteristics: Aluminum Electrolytic Capacitor; Recommended soldering: Wave; Operating temperature:–40 °C to +105 °C for UR < 400 V; –25 °C to +105 °C for UR ≥ 400 V; General purpose product series with max. temperature of +105 °C; Load life: 2000 h @ +105 °C; ComponentLink1Description: Manufacturer; ComponentLink1URL: http://www.we-online.com; ComponentLink2Description: Datasheet; ComponentLink2URL: http://katalog.we-online.de/pbs/datasheet/860021381022.pdf; Created by: Karrer Zheng; Created Date: 6/8/2015; Capacitance: 150 μF; Application: Medium and high voltage type range from 160V-450V used as primary side input filter in power supply; Low voltage type used as energy storage or low frequency filtering in circuit, applied to general switching power supply, AC-DC converter, adapter, charger, TV, VCR, DC motor circuit filter, digital audio, digital cameras, digital video cameras, satellite receiver etc.
footprint WCAP-ATG5 18x35.5x7.5x0.8
pins: 1, 2

## WCAP-ATG5 18x45x7.5x0.8 860021381024
designator C?, comment 180 μF
WCAP-ATG5 Aluminum Electrolytic Capacitors , 180 μF; + / - 20%; 400 V , 18 x 45; Manufacturer: Wurth Elektronik; partNo: 860021381024; E-mail: libraries@we-online.com; Characteristics: Aluminum Electrolytic Capacitor; Recommended soldering: Wave; Operating temperature:–40 °C to +105 °C for UR < 400 V; –25 °C to +105 °C for UR ≥ 400 V; General purpose product series with max. temperature of +105 °C; Load life: 2000 h @ +105 °C; ComponentLink1Description: Manufacturer; ComponentLink1URL: http://www.we-online.com; ComponentLink2Description: Datasheet; ComponentLink2URL: http://katalog.we-online.de/pbs/datasheet/860021381024.pdf; Created by: Karrer Zheng; Created Date: 6/8/2015; Capacitance: 180 μF; Application: Medium and high voltage type range from 160V-450V used as primary side input filter in power supply; Low voltage type used as energy storage or low frequency filtering in circuit, applied to general switching power supply, AC-DC converter, adapter, charger, TV, VCR, DC motor circuit filter, digital audio, digital cameras, digital video cameras, satellite receiver etc.
footprint WCAP-ATG5 18x45x7.5x0.8
pins: 1, 2

## WCAP-ATG5 22x31x10x0.8 860021383023
designator C?, comment 150 μF
WCAP-ATG5 Aluminum Electrolytic Capacitors , 150 μF; + / - 20%; 400 V , 22 x 31; Manufacturer: Wurth Elektronik; partNo: 860021383023; E-mail: libraries@we-online.com; Characteristics: Aluminum Electrolytic Capacitor; Recommended soldering: Wave; Operating temperature:–40 °C to +105 °C for UR < 400 V; –25 °C to +105 °C for UR ≥ 400 V; General purpose product series with max. temperature of +105 °C; Load life: 2000 h @ +105 °C; ComponentLink1Description: Manufacturer; ComponentLink1URL: http://www.we-online.com; ComponentLink2Description: Datasheet; ComponentLink2URL: http://katalog.we-online.de/pbs/datasheet/860021383023.pdf; Created by: Karrer Zheng; Created Date: 6/8/2015; Capacitance: 150 μF; Application: Medium and high voltage type range from 160V-450V used as primary side input filter in power supply; Low voltage type used as energy storage or low frequency filtering in circuit, applied to general switching power supply, AC-DC converter, adapter, charger, TV, VCR, DC motor circuit filter, digital audio, digital cameras, digital video cameras, satellite receiver etc.
footprint WCAP-ATG5 22x31x10x0.8
pins: 1, 2


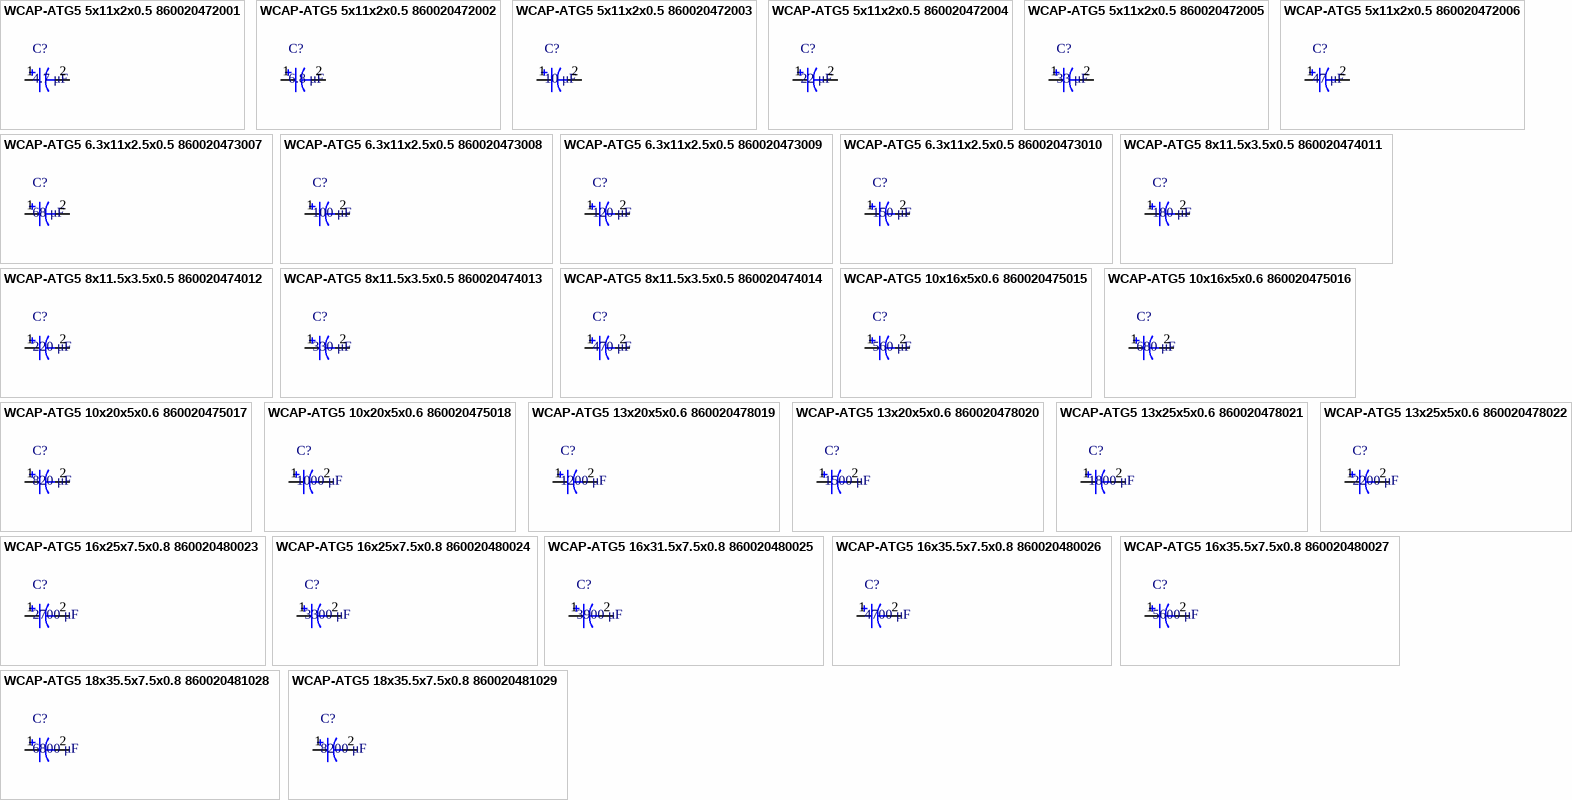
[diagram p6: symbols WCAP-ATG5 5x11x2x0.5 860020472001 to WCAP-ATG5 18x35.5x7.5x0.8 860020481029]

## WCAP-ATG5 5x11x2x0.5 860020472001
designator C?, comment 4.7 μF
WCAP-ATG5 Aluminum Electrolytic Capacitors , 4,7 μF; + / - 20%; 25 V , 5 x 11; Manufacturer: Wurth Elektronik; partNo: 860020472001; E-mail: libraries@we-online.com; Characteristics: Aluminum Electrolytic Capacitor; Recommended soldering: Wave; Operating temperature:–40 °C to +105 °C for UR < 400 V; –25 °C to +105 °C for UR ≥ 400 V; General purpose product series with max. temperature of +105 °C; Load life: 2000 h @ +105 °C; ComponentLink1Description: Manufacturer; ComponentLink1URL: http://www.we-online.com; ComponentLink2Description: Datasheet; ComponentLink2URL: http://katalog.we-online.de/pbs/datasheet/860020472001.pdf; Created by: Karrer Zheng; Created Date: 6/8/2015; Capacitance: 4.7 μF; Application: Medium and high voltage type range from 160V-450V used as primary side input filter in power supply; Low voltage type used as energy storage or low frequency filtering in circuit, applied to general switching power supply, AC-DC converter, adapter, charger, TV, VCR, DC motor circuit filter, digital audio, digital cameras, digital video cameras, satellite receiver etc.
footprint WCAP-ATG5 5x11x2x0.5
pins: 1, 2

## WCAP-ATG5 5x11x2x0.5 860020472002
designator C?, comment 6.8 μF
WCAP-ATG5 Aluminum Electrolytic Capacitors , 6,8 μF; + / - 20%; 25 V , 5 x 11; Manufacturer: Wurth Elektronik; partNo: 860020472002; E-mail: libraries@we-online.com; Characteristics: Aluminum Electrolytic Capacitor; Recommended soldering: Wave; Operating temperature:–40 °C to +105 °C for UR < 400 V; –25 °C to +105 °C for UR ≥ 400 V; General purpose product series with max. temperature of +105 °C; Load life: 2000 h @ +105 °C; ComponentLink1Description: Manufacturer; ComponentLink1URL: http://www.we-online.com; ComponentLink2Description: Datasheet; ComponentLink2URL: http://katalog.we-online.de/pbs/datasheet/860020472002.pdf; Created by: Karrer Zheng; Created Date: 6/8/2015; Capacitance: 6.8 μF; Application: Medium and high voltage type range from 160V-450V used as primary side input filter in power supply; Low voltage type used as energy storage or low frequency filtering in circuit, applied to general switching power supply, AC-DC converter, adapter, charger, TV, VCR, DC motor circuit filter, digital audio, digital cameras, digital video cameras, satellite receiver etc.
footprint WCAP-ATG5 5x11x2x0.5
pins: 1, 2

## WCAP-ATG5 5x11x2x0.5 860020472003
designator C?, comment 10 μF
WCAP-ATG5 Aluminum Electrolytic Capacitors , 10 μF; + / - 20%; 25 V , 5 x 11; Manufacturer: Wurth Elektronik; partNo: 860020472003; E-mail: libraries@we-online.com; Characteristics: Aluminum Electrolytic Capacitor; Recommended soldering: Wave; Operating temperature:–40 °C to +105 °C for UR < 400 V; –25 °C to +105 °C for UR ≥ 400 V; General purpose product series with max. temperature of +105 °C; Load life: 2000 h @ +105 °C; ComponentLink1Description: Manufacturer; ComponentLink1URL: http://www.we-online.com; ComponentLink2Description: Datasheet; ComponentLink2URL: http://katalog.we-online.de/pbs/datasheet/860020472003.pdf; Created by: Karrer Zheng; Created Date: 6/8/2015; Capacitance: 10 μF; Application: Medium and high voltage type range from 160V-450V used as primary side input filter in power supply; Low voltage type used as energy storage or low frequency filtering in circuit, applied to general switching power supply, AC-DC converter, adapter, charger, TV, VCR, DC motor circuit filter, digital audio, digital cameras, digital video cameras, satellite receiver etc.
footprint WCAP-ATG5 5x11x2x0.5
pins: 1, 2

## WCAP-ATG5 5x11x2x0.5 860020472004
designator C?, comment 22 μF
WCAP-ATG5 Aluminum Electrolytic Capacitors , 22 μF; + / - 20%; 25 V , 5 x 11; Manufacturer: Wurth Elektronik; partNo: 860020472004; E-mail: libraries@we-online.com; Characteristics: Aluminum Electrolytic Capacitor; Recommended soldering: Wave; Operating temperature:–40 °C to +105 °C for UR < 400 V; –25 °C to +105 °C for UR ≥ 400 V; General purpose product series with max. temperature of +105 °C; Load life: 2000 h @ +105 °C; ComponentLink1Description: Manufacturer; ComponentLink1URL: http://www.we-online.com; ComponentLink2Description: Datasheet; ComponentLink2URL: http://katalog.we-online.de/pbs/datasheet/860020472004.pdf; Created by: Karrer Zheng; Created Date: 6/8/2015; Capacitance: 22 μF; Application: Medium and high voltage type range from 160V-450V used as primary side input filter in power supply; Low voltage type used as energy storage or low frequency filtering in circuit, applied to general switching power supply, AC-DC converter, adapter, charger, TV, VCR, DC motor circuit filter, digital audio, digital cameras, digital video cameras, satellite receiver etc.
footprint WCAP-ATG5 5x11x2x0.5
pins: 1, 2

## WCAP-ATG5 5x11x2x0.5 860020472005
designator C?, comment 33 μF
WCAP-ATG5 Aluminum Electrolytic Capacitors , 33 μF; + / - 20%; 25 V , 5 x 11; Manufacturer: Wurth Elektronik; partNo: 860020472005; E-mail: libraries@we-online.com; Characteristics: Aluminum Electrolytic Capacitor; Recommended soldering: Wave; Operating temperature:–40 °C to +105 °C for UR < 400 V; –25 °C to +105 °C for UR ≥ 400 V; General purpose product series with max. temperature of +105 °C; Load life: 2000 h @ +105 °C; ComponentLink1Description: Manufacturer; ComponentLink1URL: http://www.we-online.com; ComponentLink2Description: Datasheet; ComponentLink2URL: http://katalog.we-online.de/pbs/datasheet/860020472005.pdf; Created by: Karrer Zheng; Created Date: 6/8/2015; Capacitance: 33 μF; Application: Medium and high voltage type range from 160V-450V used as primary side input filter in power supply; Low voltage type used as energy storage or low frequency filtering in circuit, applied to general switching power supply, AC-DC converter, adapter, charger, TV, VCR, DC motor circuit filter, digital audio, digital cameras, digital video cameras, satellite receiver etc.
footprint WCAP-ATG5 5x11x2x0.5
pins: 1, 2

## WCAP-ATG5 5x11x2x0.5 860020472006
designator C?, comment 47 μF
WCAP-ATG5 Aluminum Electrolytic Capacitors , 47 μF; + / - 20%; 25 V , 5 x 11; Manufacturer: Wurth Elektronik; partNo: 860020472006; E-mail: libraries@we-online.com; Characteristics: Aluminum Electrolytic Capacitor; Recommended soldering: Wave; Operating temperature:–40 °C to +105 °C for UR < 400 V; –25 °C to +105 °C for UR ≥ 400 V; General purpose product series with max. temperature of +105 °C; Load life: 2000 h @ +105 °C; ComponentLink1Description: Manufacturer; ComponentLink1URL: http://www.we-online.com; ComponentLink2Description: Datasheet; ComponentLink2URL: http://katalog.we-online.de/pbs/datasheet/860020472006.pdf; Created by: Karrer Zheng; Created Date: 6/8/2015; Capacitance: 47 μF; Application: Medium and high voltage type range from 160V-450V used as primary side input filter in power supply; Low voltage type used as energy storage or low frequency filtering in circuit, applied to general switching power supply, AC-DC converter, adapter, charger, TV, VCR, DC motor circuit filter, digital audio, digital cameras, digital video cameras, satellite receiver etc.
footprint WCAP-ATG5 5x11x2x0.5
pins: 1, 2

## WCAP-ATG5 6.3x11x2.5x0.5 860020473007
designator C?, comment 68 μF
WCAP-ATG5 Aluminum Electrolytic Capacitors , 68 μF; + / - 20%; 25 V , 6,3 x 11; Manufacturer: Wurth Elektronik; partNo: 860020473007; E-mail: libraries@we-online.com; Characteristics: Aluminum Electrolytic Capacitor; Recommended soldering: Wave; Operating temperature:–40 °C to +105 °C for UR < 400 V; –25 °C to +105 °C for UR ≥ 400 V; General purpose product series with max. temperature of +105 °C; Load life: 2000 h @ +105 °C; ComponentLink1Description: Manufacturer; ComponentLink1URL: http://www.we-online.com; ComponentLink2Description: Datasheet; ComponentLink2URL: http://katalog.we-online.de/pbs/datasheet/860020473007.pdf; Created by: Karrer Zheng; Created Date: 6/8/2015; Capacitance: 68 μF; Application: Medium and high voltage type range from 160V-450V used as primary side input filter in power supply; Low voltage type used as energy storage or low frequency filtering in circuit, applied to general switching power supply, AC-DC converter, adapter, charger, TV, VCR, DC motor circuit filter, digital audio, digital cameras, digital video cameras, satellite receiver etc.
footprint WCAP-ATG5 6.3x11x2.5x0.5
pins: 1, 2

## WCAP-ATG5 6.3x11x2.5x0.5 860020473008
designator C?, comment 100 μF
WCAP-ATG5 Aluminum Electrolytic Capacitors , 100 μF; + / - 20%; 25 V , 6,3 x 11; Manufacturer: Wurth Elektronik; partNo: 860020473008; E-mail: libraries@we-online.com; Characteristics: Aluminum Electrolytic Capacitor; Recommended soldering: Wave; Operating temperature:–40 °C to +105 °C for UR < 400 V; –25 °C to +105 °C for UR ≥ 400 V; General purpose product series with max. temperature of +105 °C; Load life: 2000 h @ +105 °C; ComponentLink1Description: Manufacturer; ComponentLink1URL: http://www.we-online.com; ComponentLink2Description: Datasheet; ComponentLink2URL: http://katalog.we-online.de/pbs/datasheet/860020473008.pdf; Created by: Karrer Zheng; Created Date: 6/8/2015; Capacitance: 100 μF; Application: Medium and high voltage type range from 160V-450V used as primary side input filter in power supply; Low voltage type used as energy storage or low frequency filtering in circuit, applied to general switching power supply, AC-DC converter, adapter, charger, TV, VCR, DC motor circuit filter, digital audio, digital cameras, digital video cameras, satellite receiver etc.
footprint WCAP-ATG5 6.3x11x2.5x0.5
pins: 1, 2

## WCAP-ATG5 6.3x11x2.5x0.5 860020473009
designator C?, comment 120 μF
WCAP-ATG5 Aluminum Electrolytic Capacitors , 120 μF; + / - 20%; 25 V , 6,3 x 11; Manufacturer: Wurth Elektronik; partNo: 860020473009; E-mail: libraries@we-online.com; Characteristics: Aluminum Electrolytic Capacitor; Recommended soldering: Wave; Operating temperature:–40 °C to +105 °C for UR < 400 V; –25 °C to +105 °C for UR ≥ 400 V; General purpose product series with max. temperature of +105 °C; Load life: 2000 h @ +105 °C; ComponentLink1Description: Manufacturer; ComponentLink1URL: http://www.we-online.com; ComponentLink2Description: Datasheet; ComponentLink2URL: http://katalog.we-online.de/pbs/datasheet/860020473009.pdf; Created by: Karrer Zheng; Created Date: 6/8/2015; Capacitance: 120 μF; Application: Medium and high voltage type range from 160V-450V used as primary side input filter in power supply; Low voltage type used as energy storage or low frequency filtering in circuit, applied to general switching power supply, AC-DC converter, adapter, charger, TV, VCR, DC motor circuit filter, digital audio, digital cameras, digital video cameras, satellite receiver etc.
footprint WCAP-ATG5 6.3x11x2.5x0.5
pins: 1, 2